# Altium footprint library connectors.PCBLIB: 188 footprints (part 7 of 12)
Each footprint in its own frame and in the unit in brackets; x right, y up, seen from the top. Pads: shape width x height; smd on the part's side, far side on the other; paste and mask are expansions set on the pad; w line width, h text height; cw(c..) or ccw(c..) is an arc to the next point about the centre after c.
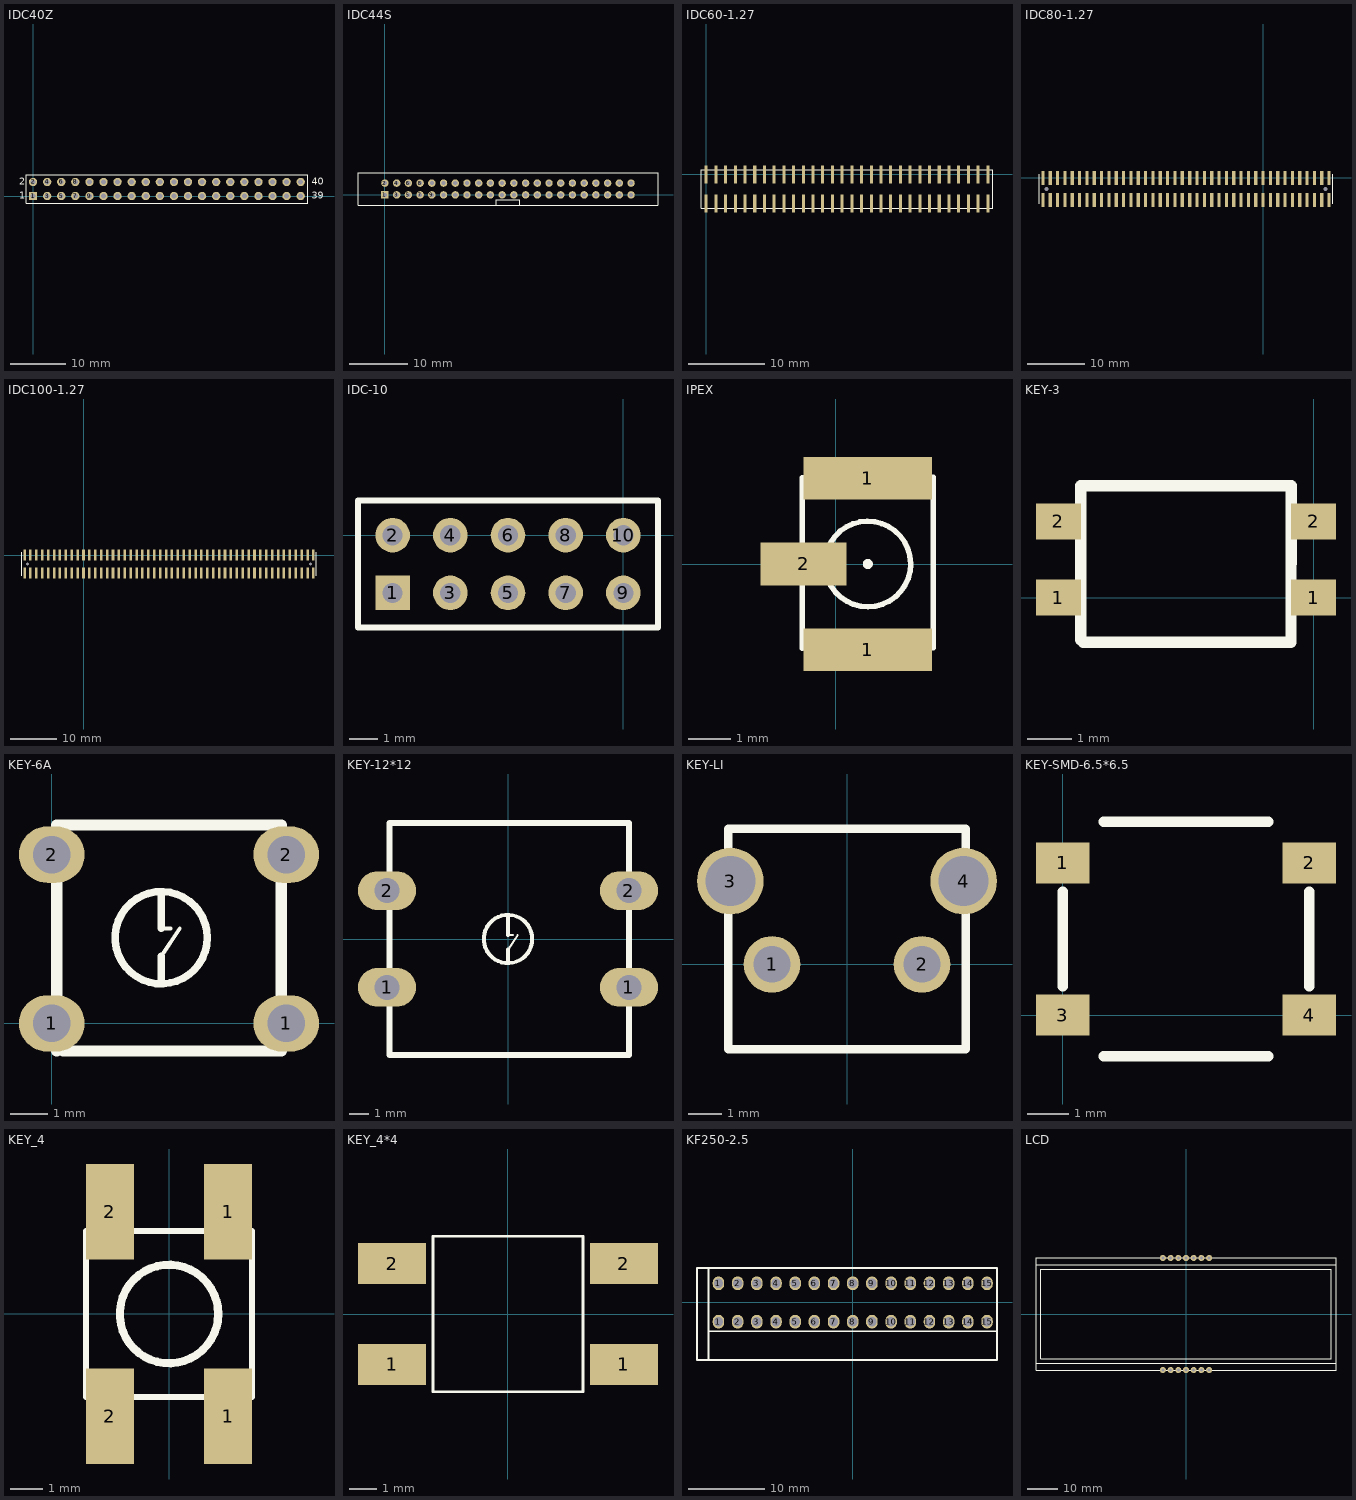
[diagram p6: the footprints below, top view; thin cyan lines are the x and y axes]

## IDC40Z [mm] "Connector; Header; 20x2 Position"
height 3.5
pads (40):
  rect 1.5x1.5 hole 0.9: 1(0,0)
  round 1.5 hole 0.9: 2(0,2.54) 3(2.54,0) 4(2.54,2.54) 5(5.08,0) 6(5.08,2.54) 7(7.62,0) 8(7.62,2.54) 9(10.16,0) 10(10.16,2.54) 11(12.7,0) 12(12.7,2.54) 13(15.24,0) 14(15.24,2.54) 15(17.78,0) 16(17.78,2.54) 17(20.32,0) 18(20.32,2.54) 19(22.86,0) 20(22.86,2.54) 21(25.4,0) 22(25.4,2.54) 23(27.94,0) 24(27.94,2.54) 25(30.48,0) 26(30.48,2.54) 27(33.02,0) 28(33.02,2.54) 29(35.56,0) 30(35.56,2.54) 31(38.1,0) 32(38.1,2.54) 33(40.64,0) 34(40.64,2.54) 35(43.18,0) 36(43.18,2.54) 37(45.72,0) 38(45.72,2.54) 39(48.26,0) 40(48.26,2.54)
Top Overlay:
  lines w0.2: -1.27,-1.27 -1.27,3.81 49.53,3.81 49.53,-1.27 -1.27,-1.27
  text "39" at 50.292,-0.508 h1.27
  text "40" at 50.292,2.032 h1.27
  text "2" at -2.54,2.032 h1.27
  text "1" at -2.54,-0.508 h1.27

## IDC44S [mm]
pads (44):
  rect 1.27x1.27 hole 0.7: 1(0,0)
  round 1.27 hole 0.7: 2(0,2) 3(2,0) 4(2,2) 5(4,0) 6(4,2) 7(6,0) 8(6,2) 9(8,0) 10(8,2) 11(10,0) 12(10,2) 13(12,0) 14(12,2) 15(14,0) 16(14,2) 17(16,0) 18(16,2) 19(18,0) 20(18,2) 21(20,0) 22(20,2) 23(22,0) 24(22,2) 25(24,0) 26(24,2) 27(26,0) 28(26,2) 29(28,0) 30(28,2) 31(30,0) 32(30,2) 33(32,0) 34(32,2) 35(34,0) 36(34,2) 37(36,0) 38(36,2) 39(38,0) 40(38,2) 41(40,0) 42(40,2) 43(42,0) 44(42,2)
Top Overlay:
  lines w0.2: 19,-1.754 19,-0.8 23,-0.8 23,-1.754 ; -4.6,-1.754 46.6,-1.754 46.6,3.754 -4.6,3.754 -4.6,-1.754

## IDC60-1.27 [mm]
pads (60):
  rect 0.4x2.4 smd: 1(0,0) 2(0,-3.81) 3(1.27,0) 4(1.27,-3.81) 5(2.54,0) 6(2.54,-3.81) 7(3.81,0) 8(3.81,-3.81) 9(5.08,0) 10(5.08,-3.81) 11(6.35,0) 12(6.35,-3.81) 13(7.62,0) 14(7.62,-3.81) 15(8.89,0) 16(8.89,-3.81) 17(10.16,0) 18(10.16,-3.81) 19(11.43,0) 20(11.43,-3.81) 21(12.7,0) 22(12.7,-3.81) 23(13.97,0) 24(13.97,-3.81) 25(15.24,0) 26(15.24,-3.81) 27(16.51,0) 28(16.51,-3.81) 29(17.78,0) 30(17.78,-3.81) 31(19.05,0) 32(19.05,-3.81) 33(20.32,0) 34(20.32,-3.81) 35(21.59,0) 36(21.59,-3.81) 37(22.86,0) 38(22.86,-3.81) 39(24.13,0) 40(24.13,-3.81) 41(25.4,0) 42(25.4,-3.81) 43(26.67,0) 44(26.67,-3.81) 45(27.94,0) 46(27.94,-3.81) 47(29.21,0) 48(29.21,-3.81) 49(30.48,0) 50(30.48,-3.81) 51(31.75,0) 52(31.75,-3.81) 53(33.02,0) 54(33.02,-3.81) 55(34.29,0) 56(34.29,-3.81) 57(35.56,0) 58(35.56,-3.81) 59(36.83,0) 60(36.83,-3.81)
Top Overlay:
  lines w0.1: -0.635,-4.445 18.415,-4.445 37.465,-4.445 37.465,0.635 18.415,0.635 -0.635,0.635 -0.635,-4.445

## IDC80-1.27 [mm]
pads (82):
  rect 0.55x2.4 smd: 1(-38.1,0) 2(-38.1,-3.81) 3(-36.83,0) 4(-36.83,-3.81) 5(-35.56,0) 6(-35.56,-3.81) 7(-34.29,0) 8(-34.29,-3.81) 9(-33.02,0) 10(-33.02,-3.81) 11(-31.75,0) 12(-31.75,-3.81) 13(-30.48,0) 14(-30.48,-3.81) 15(-29.21,0) 16(-29.21,-3.81) 17(-27.94,0) 18(-27.94,-3.81) 19(-26.67,0) 20(-26.67,-3.81) 21(-25.4,0) 22(-25.4,-3.81) 23(-24.13,0) 24(-24.13,-3.81) 25(-22.86,0) 26(-22.86,-3.81) 27(-21.59,0) 28(-21.59,-3.81) 29(-20.32,0) 30(-20.32,-3.81) 31(-19.05,0) 32(-19.05,-3.81) 33(-17.78,0) 34(-17.78,-3.81) 35(-16.51,0) 36(-16.51,-3.81) 37(-15.24,0) 38(-15.24,-3.81) 39(-13.97,0) 40(-13.97,-3.81) 41(-12.7,0) 42(-12.7,-3.81) 43(-11.43,0) 44(-11.43,-3.81) 45(-10.16,0) 46(-10.16,-3.81) 47(-8.89,0) 48(-8.89,-3.81) 49(-7.62,0) 50(-7.62,-3.81) 51(-6.35,0) 52(-6.35,-3.81) 53(-5.08,0) 54(-5.08,-3.81) 55(-3.81,0) 56(-3.81,-3.81) 57(-2.54,0) 58(-2.54,-3.81) 59(-1.27,0) 60(-1.27,-3.81) 61(0,0) 62(0,-3.81) 63(1.27,0) 64(1.27,-3.81) 65(2.54,0) 66(2.54,-3.81) 67(3.81,0) 68(3.81,-3.81) 69(5.08,0) 70(5.08,-3.81) 71(6.35,0) 72(6.35,-3.81) 73(7.62,0) 74(7.62,-3.81) 75(8.89,0) 76(8.89,-3.81) 77(10.16,0) 78(10.16,-3.81) 79(11.43,0) 80(11.43,-3.81)
  round 0.5 hole 0.7: 21(10.795,-1.905) 22(-37.465,-1.905)
Top Overlay:
  lines w0.1: -38.735,-4.445 -38.735,0.635 ; 12.065,-4.445 12.065,0.635

## IDC100-1.27 [mm]
pads (102):
  rect 0.55x2.4 smd: 1(-12.7,0) 2(-12.7,-3.81) 3(-11.43,0) 4(-11.43,-3.81) 5(-10.16,0) 6(-10.16,-3.81) 7(-8.89,0) 8(-8.89,-3.81) 9(-7.62,0) 10(-7.62,-3.81) 11(-6.35,0) 12(-6.35,-3.81) 13(-5.08,0) 14(-5.08,-3.81) 15(-3.81,0) 16(-3.81,-3.81) 17(-2.54,0) 18(-2.54,-3.81) 19(-1.27,0) 20(-1.27,-3.81) 21(0,0) 22(0,-3.81) 23(1.27,0) 24(1.27,-3.81) 25(2.54,0) 26(2.54,-3.81) 27(3.81,0) 28(3.81,-3.81) 29(5.08,0) 30(5.08,-3.81) 31(6.35,0) 32(6.35,-3.81) 33(7.62,0) 34(7.62,-3.81) 35(8.89,0) 36(8.89,-3.81) 37(10.16,0) 38(10.16,-3.81) 39(11.43,0) 40(11.43,-3.81) 41(12.7,0) 42(12.7,-3.81) 43(13.97,0) 44(13.97,-3.81) 45(15.24,0) 46(15.24,-3.81) 47(16.51,0) 48(16.51,-3.81) 49(17.78,0) 50(17.78,-3.81) 51(19.05,0) 52(19.05,-3.81) 53(20.32,0) 54(20.32,-3.81) 55(21.59,0) 56(21.59,-3.81) 57(22.86,0) 58(22.86,-3.81) 59(24.13,0) 60(24.13,-3.81) 61(25.4,0) 62(25.4,-3.81) 63(26.67,0) 64(26.67,-3.81) 65(27.94,0) 66(27.94,-3.81) 67(29.21,0) 68(29.21,-3.81) 69(30.48,0) 70(30.48,-3.81) 71(31.75,0) 72(31.75,-3.81) 73(33.02,0) 74(33.02,-3.81) 75(34.29,0) 76(34.29,-3.81) 77(35.56,0) 78(35.56,-3.81) 79(36.83,0) 80(36.83,-3.81) 81(38.1,0) 82(38.1,-3.81) 83(39.37,0) 84(39.37,-3.81) 85(40.64,0) 86(40.64,-3.81) 87(41.91,0) 88(41.91,-3.81) 89(43.18,0) 90(43.18,-3.81) 91(44.45,0) 92(44.45,-3.81) 93(45.72,0) 94(45.72,-3.81) 95(46.99,0) 96(46.99,-3.81) 97(48.26,0) 98(48.26,-3.81) 99(49.53,0) 100(49.53,-3.81)
  round 0.5 hole 0.7: 21(48.895,-1.905) 22(-12.065,-1.905)
Top Overlay:
  lines w0.1: -13.335,-4.445 -13.335,0.635 ; 50.165,-4.445 50.165,0.635

## IDC-10 [mm]
pads (10):
  rect 1.2x1.2 hole 0.7: 1(-8,-2)
  round 1.2 hole 0.7: 2(-8,0) 3(-6,-2) 4(-6,0) 5(-4,-2) 6(-4,0) 7(-2,-2) 8(-2,0) 9(0,-2) 10(0,0)
Top Overlay:
  lines w0.2: -9.2,-3.2 -0.7,-3.2 1.2,-3.2 1.2,1.2 -9.2,1.2 -9.2,-3.2

## IPEX [mm]
pads (3):
  rect 3x1 smd: 1(0.75,-2) 1(0.75,2)
  rect 2x1 smd: 2(-0.75,0)
Top Overlay:
  circle w0.127: c0.75,0 r0.052
  lines w0.127: 1.75,0 cw(c0.75,0) 1.75,0.016 ; -0.784,-1.969 -0.768,-1.953 2.278,-1.953 2.278,2.025 2.261,2.008 -0.784,2.008 -0.784,-1.969

## KEY-3 [mm]
pads (4):
  rect 1x0.8 smd: 1(-5.7,0) 1(0,0) 2(-5.7,1.7) 2(0,1.7)
Top Overlay:
  lines w0.254: -5.2,-0.946 -5.2,2.5 -0.5,2.5 ; -5.146,-1 -0.504,-1 -0.5,2.45

## KEY-6A [mil]
pads (4):
  oval 70x60 hole 40: 1(0,0) 1(250,0) 2(0,180) 2(250,180)
Top Overlay:
  circle w8: c116.73,91.39 r49.21
  lines w4: 116.73,71.71 136.42,101.24 ; 116.73,101.24 126.58,101.24
  lines w8: 116.73,42.18 116.73,71.71 ; 116.73,101.23 116.73,140.61
  lines w12: 5.32,-29.47 5.32,211.47 244.69,211.47 244.69,-29.47 12.21,-29.47

## KEY-12*12 [mm]
pads (4):
  oval 3x2 hole 1.3: 1(-6.25,-2.5) 1(6.25,-2.5) 2(-6.25,2.5) 2(6.25,2.5)
Top Overlay:
  circle w0.203: c0,0 r1.25
  lines w0.102: 0,-0.55 0.5,0.2 ; 0,0.2 0.25,0.2
  lines w0.203: 0,-1.2 0,-0.55 ; 0,0.2 0,1.2
  lines w0.305: -6.115,-6 -6.115,6 6.25,6 6.25,-6 -6.1,-6

## KEY-LI [mm]
pads (4):
  round 1.7 hole 1.1: 1(-2.25,0) 2(2.25,0)
  round 2 hole 1.5: 3(-3.5,2.5) 4(3.5,2.5)
Top Overlay:
  lines w0.254: 3.531,4.064 -3.556,4.064 -3.556,-1.549 -3.556,-2.54 3.556,-2.54 3.556,4.064

## KEY-SMD-6.5*6.5 [mm]
pads (4):
  rect 1.3x1 smd: 1(0,3.7) 2(6,3.7) 3(0,0) 4(6,0)
Top Overlay:
  lines w0.254: 0,0.7 0,3 ; 1,-1 5,-1 ; 1,4.7 5,4.7 ; 6,0.7 6,3

## KEY_4 [mm]
height 2.54
pads (4):
  rect 1.5x3 smd: 1(1.85,-3.2) 1(1.85,3.2) 2(-1.85,-3.2) 2(-1.85,3.2)
Top Overlay:
  circle w0.254: c0,0 r1.544
  lines w0.2: -2.6,-2.6 2.6,-2.6 2.6,2.6 -2.6,2.6 -2.6,-2.6

## KEY_4*4 [mm]
pads (4):
  rect 2.5x1.5 smd: 1(-4.25,-1.85) 1(4.25,-1.85) 2(-4.25,1.85) 2(4.25,1.85)
Top Overlay:
  lines w0.1: -2.75,-2.85 -2.75,2.85 2.75,2.85 2.75,-2.85 -2.75,-2.85

## KF250-2.5 [mm]
pads (30):
  oval 1.5x1.8 hole 1.2: 1(-17.5,-2.5) 1(-17.5,2.5) 2(-15,-2.5) 2(-15,2.5) 3(-12.5,-2.5) 3(-12.5,2.5) 4(-10,-2.5) 4(-10,2.5) 5(-7.5,-2.5) 5(-7.5,2.5) 6(-5,-2.5) 6(-5,2.5) 7(-2.5,-2.5) 7(-2.5,2.5) 8(0,-2.5) 8(0,2.5) 9(2.5,-2.5) 9(2.5,2.5) 10(5,-2.5) 10(5,2.5) 11(7.5,-2.5) 11(7.5,2.5) 12(10,-2.5) 12(10,2.5) 13(12.5,-2.5) 13(12.5,2.5) 14(15,-2.5) 14(15,2.5) 15(17.5,-2.5) 15(17.5,2.5)
Top Overlay:
  lines w0.254: -18.8,-7.5 -18.8,4.5 ; -18.8,-3.75 18.8,-3.75 ; -20.3,-7.5 -20.3,4.5 18.8,4.5 18.8,-7.5 -20.3,-7.5

## LCD [mm]
height 6.86
pads (14):
  round 2 hole 1: 1(-7.62,-18.5) 2(-5.08,-18.5) 3(-2.54,-18.5) 4(0,-18.5) 5(2.54,-18.5) 6(5.08,-18.5) 7(7.62,-18.5) 8(7.62,18.5) 9(5.08,18.5) 10(2.54,18.5) 11(0,18.5) 12(-2.54,18.5) 13(-5.08,18.5) 14(-7.62,18.5)
Top Overlay:
  lines w0.127: -49.5,-16.3 49.5,-16.3 ; -49.5,16.3 49.5,16.3 ; -49.5,-18.5 -49.5,18.5 49.5,18.5 49.5,-18.5 -49.5,-18.5 ; -48,-14.8 -48,14.8 48,14.8 48,-14.8 -48,-14.8